# Altium footprint library 集大电协1.2.PcbLib: 175 footprints (part 10 of 11)
Each footprint in its own frame and in the unit in brackets; x right, y up, seen from the top. Pads: shape width x height; smd on the part's side, far side on the other; paste and mask are expansions set on the pad; w line width, h text height; cw(c..) or ccw(c..) is an arc to the next point about the centre after c.
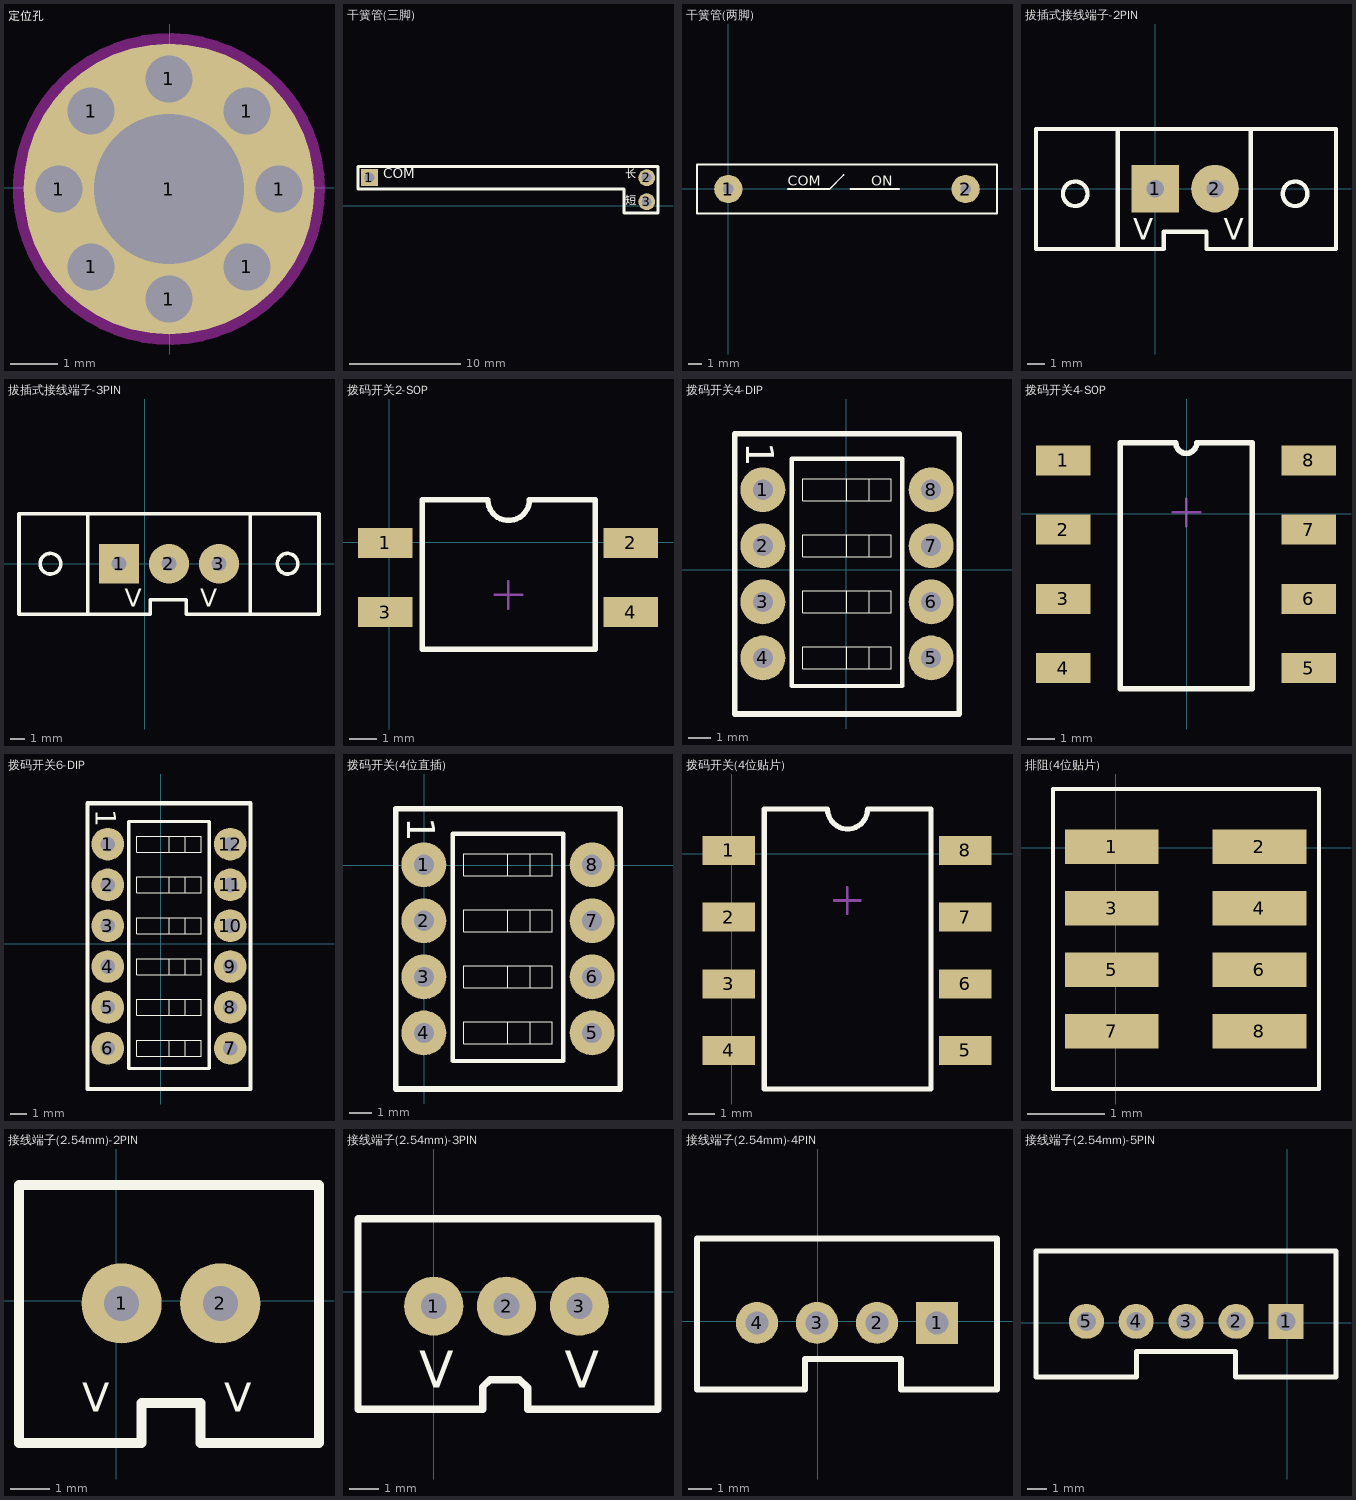
[diagram p9: the footprints below, top view; thin cyan lines are the x and y axes]

## 定位孔 [mm]
pads (9):
  round 1 hole 1: 1(-2.368,-0.023) 1(-1.679,-1.685) 1(-1.679,1.638) 1(-0.018,-2.373) 1(-0.018,2.327) 1(1.644,-1.685) 1(1.644,1.638) 1(2.332,-0.023)
  round 6.2 hole 3.2: 1(-0.018,-0.023)
Keep-Out Layer:
  circle w0.254: c-0.018,-0.023 r3.2

## 干簧管(三脚) [mil]
pads (3):
  rect 60x60 hole 35: 1(95,100)
  round 60 hole 35: 2(1075,100) 3(1075,15)
Top Overlay:
  lines w10: 55,60 55,140 1115,140 1115,-25 995,-25 995,60 55,60
  text "长" at 1000,90 h50
  text "短" at 1000,-5 h50
  text "COM" at 145,85 h60
3D body: height 69.95, standoff -9.95, extent 418.15,65 811.85,144.79
3D body: height 44.97, standoff 5.03, extent 368.15,84.89 418.15,124.89
3D body: height 44.97, standoff 5.03, extent 813.15,84.9 863.15,124.9

## 干簧管(两脚) [mil]
pads (2):
  round 80 hole 30: 1(0.98,-0.98) 2(670.28,-0.98)
Top Overlay:
  lines w5: 168.31,-0.98 286.42,-0.98 325.79,38.39 ; 345.47,-0.98 483.27,-0.98 ; -87.6,-69.88 758.86,-69.88 758.86,67.91 -87.6,67.91 -87.6,-69.88
  text "COM" at 168.31,-0.98 h50
  text "ON" at 404.53,-0.98 h50
3D body: height 44.97, standoff 5.03, extent 633.86,-20.47 683.86,19.53
3D body: height 44.97, standoff 5.03, extent -8.86,-20.98 41.14,19.02
3D body: height 69.92, standoff -9.92, extent 43.31,-40.31 633.86,39.37

## 拔插式接线端子-2PIN [mil]
pads (2):
  rect 110x110 hole 40: 1(0,0)
  round 110 hole 40: 2(137.8,0)
Top Overlay:
  circle w10: c322.83,-11.81 r28.39
  circle w10: c-185.04,-11.81 r28.39
  lines w10: -86.61,-139.32 -86.61,137.8 ; 220.47,-137.8 220.47,137.8 ; -275.59,-139.32 -275.59,137.8 417.32,137.8 417.32,-139.32 118.11,-139.32 118.11,-99.32 19.68,-99.32 19.68,-139.32 -275.59,-139.32
  text "V" at -51.18,-118.11 h50
  text "V" at 157.48,-118.11 h50
3D body: height 433.07, standoff -78.74, extent -129.92,-157.48 263.78,157.48

## 拔插式接线端子-3PIN [mil]
pads (3):
  rect 110x110 hole 40: 1(-70.87,0)
  round 110 hole 40: 2(66.93,0) 3(204.72,0)
Top Overlay:
  circle w10: c393.7,0 r28.39
  circle w10: c-259.84,0 r28.39
  lines w10: -157.48,-139.32 -157.48,137.8 ; 291.34,-137.8 291.34,137.8 ; -346.46,-139.32 -346.46,137.8 480.31,137.8 480.31,-139.32 114.17,-139.32 114.17,-99.32 15.75,-99.32 15.75,-139.32 -346.46,-139.32
  text "V" at -55.12,-118.11 h50
  text "V" at 153.54,-118.11 h50
3D body: height 433.07, standoff -78.74, extent -236.22,-161.42 354.33,153.54

## 拨码开关2-SOP [mm]
pads (4):
  rect 2x1.1 smd: 1(-0.153,-0.029) 2(8.847,-0.029) 3(-0.153,-2.569) 4(8.847,-2.569)
Top Overlay:
  lines w0.2: 7.525,-3.923 1.195,-3.923 1.195,1.552 3.608,1.552 ccw(c4.37,1.552) 5.132,1.552 7.545,1.552 7.545,-3.925
Mechanical 15:
  lines w0.1: 3.857,-1.934 4.857,-1.934 ; 4.357,-2.434 4.357,-1.434
3D body: height 2, standoff 0, extent 0.925,-3.875 7.783,1.55
3D body: height 2.05, standoff 2, extent 2.338,-0.734 6.783,0.79
3D body: height 2.05, standoff 2, extent 2.338,-3.274 6.783,-1.75
3D body: height 2.15, standoff 2.05, extent 5.259,-0.734 6.783,0.79
3D body: height 2.15, standoff 2.05, extent 2.338,-3.274 3.862,-1.75

## 拨码开关4-DIP [mil]
pads (8):
  round 80 hole 36: 1(-148.7,142.5) 2(-148.7,42.5) 3(-148.7,-57.5) 4(-148.7,-157.5) 5(151.3,-157.5) 6(151.3,-57.5) 7(151.3,42.5) 8(151.3,142.5)
Top Overlay:
  lines w0.98: 1.3,-177.19 1.3,-137.82 ; 1.3,-77.19 1.3,-37.82 ; 1.3,22.81 1.3,62.18 ; 1.3,122.81 1.3,162.18 ; 40.67,-177.19 40.67,-137.82 ; 40.67,-77.19 40.67,-37.82 ; 40.67,22.81 40.67,62.18 ; 40.67,122.81 40.67,162.18 ; -77.44,-177.19 -77.44,-137.82 80.04,-137.82 80.04,-177.19 -77.44,-177.19 ; -77.44,-77.19 -77.44,-37.82 80.04,-37.82 80.04,-77.19 -77.44,-77.19 ; -77.44,22.81 -77.44,62.18 80.04,62.18 80.04,22.81 -77.44,22.81 ; -77.44,122.81 -77.44,162.18 80.04,162.18 80.04,122.81 -77.44,122.81
  lines w7.87: -97.13,-207.5 -97.13,197.62 99.73,197.62 99.73,-207.5 -97.13,-207.5
  lines w10: -198.7,-257.5 201.3,-257.5 201.3,242.5 -198.7,242.5 -198.7,-257.5
  text "1" at -178.7,227.5 h50
3D body: height 275.59, standoff -145.67, extent -195.47,-227.19 194.3,212.19

## 拨码开关4-SOP [mm]
pads (8):
  rect 2x1.1 smd: 1(-4.52,1.958) 2(-4.52,-0.582) 3(-4.52,-3.122) 4(-4.52,-5.662) 5(4.48,-5.662) 6(4.48,-3.122) 7(4.48,-0.582) 8(4.48,1.958)
Top Overlay:
  lines w0.203: -0.405,2.603 -2.423,2.603 -2.423,-6.424 2.403,-6.424 2.403,2.603 0.371,2.603 ; -0.391,2.593 ccw(c-0.01,2.593) 0.371,2.593
Mechanical 15:
  lines w0.1: -0.51,0.053 0.49,0.053 ; -0.01,-0.447 -0.01,0.553

## 拨码开关6-DIP [mil]
pads (12):
  round 80 hole 36: 1(-130.2,243.9) 2(-130.2,143.9) 3(-130.2,43.9) 4(-130.2,-56.1) 5(-130.2,-156.1) 6(-130.2,-256.1) 7(169.8,-256.1) 8(169.8,-156.1) 9(169.8,-56.1) 10(169.8,43.9) 11(169.8,143.9) 12(169.8,243.9)
Top Overlay:
  lines w0.98: 19.8,-275.79 19.8,-236.42 ; 19.8,-175.79 19.8,-136.42 ; 19.8,-75.79 19.8,-36.42 ; 19.8,24.21 19.8,63.58 ; 19.8,124.21 19.8,163.58 ; 19.8,224.21 19.8,263.58 ; 59.17,-275.79 59.17,-236.42 ; 59.17,-175.79 59.17,-136.42 ; 59.17,-75.79 59.17,-36.42 ; 59.17,24.21 59.17,63.58 ; 59.17,124.21 59.17,163.58 ; 59.17,224.21 59.17,263.58 ; -58.94,-275.79 -58.94,-236.42 98.54,-236.42 98.54,-275.79 -58.94,-275.79 ; -58.94,-175.79 -58.94,-136.42 98.54,-136.42 98.54,-175.79 -58.94,-175.79 ; -58.94,-75.79 -58.94,-36.42 98.54,-36.42 98.54,-75.79 -58.94,-75.79 ; -58.94,24.21 -58.94,63.58 98.54,63.58 98.54,24.21 -58.94,24.21 ; -58.94,124.21 -58.94,163.58 98.54,163.58 98.54,124.21 -58.94,124.21 ; -58.94,224.21 -58.94,263.58 98.54,263.58 98.54,224.21 -58.94,224.21
  lines w7.87: -78.63,-306.1 -78.63,299.02 118.23,299.02 118.23,-306.1 -78.63,-306.1
  lines w10: -180.2,-356.1 -180.2,343.9 219.8,343.9 219.8,-356.1 -180.2,-356.1
  text "1" at -160.2,328.9 h50
3D body: height 275.59, standoff -145.67, extent -177.2,-322.79 212.57,316.59

## 拨码开关(4位直插) [mil]
pads (8):
  round 80 hole 36: 1(-1,1) 2(-1,-99) 3(-1,-199) 4(-1,-299) 5(299,-299) 6(299,-199) 7(299,-99) 8(299,1)
Top Overlay:
  lines w0.98: 149,-318.69 149,-279.32 ; 149,-218.69 149,-179.32 ; 149,-118.69 149,-79.32 ; 149,-18.69 149,20.68 ; 188.37,-318.69 188.37,-279.32 ; 188.37,-218.69 188.37,-179.32 ; 188.37,-118.69 188.37,-79.32 ; 188.37,-18.69 188.37,20.68 ; 70.26,-318.69 70.26,-279.32 227.74,-279.32 227.74,-318.69 70.26,-318.69 ; 70.26,-218.69 70.26,-179.32 227.74,-179.32 227.74,-218.69 70.26,-218.69 ; 70.26,-118.69 70.26,-79.32 227.74,-79.32 227.74,-118.69 70.26,-118.69 ; 70.26,-18.69 70.26,20.68 227.74,20.68 227.74,-18.69 70.26,-18.69
  lines w7.87: 50.57,-349 50.57,56.12 247.43,56.12 247.43,-349 50.57,-349
  lines w10: -51,-399 349,-399 349,101 -51,101 -51,-399
  text "1" at -31,86 h50
3D body: height 275.59, standoff -145.67, extent -47.77,-368.69 342,70.69

## 拨码开关(4位贴片) [mm]
pads (8):
  rect 2x1.1 smd: 1(-0.103,0.121) 2(-0.103,-2.419) 3(-0.103,-4.959) 4(-0.103,-7.499) 5(8.897,-7.499) 6(8.897,-4.959) 7(8.897,-2.419) 8(8.897,0.121)
Top Overlay:
  lines w0.2: 1.245,-8.966 7.595,-8.966 7.595,1.702 5.182,1.702 cw(c4.42,1.702) 3.658,1.702 1.245,1.702 1.245,-8.966
Mechanical 15:
  lines w0.1: 3.907,-1.784 4.907,-1.784 ; 4.407,-2.284 4.407,-1.284
3D body: height 2, standoff 0, extent 0.991,-8.712 7.849,1.575
3D body: height 2.05, standoff 2, extent 2.388,-0.584 6.833,0.94
3D body: height 2.05, standoff 2, extent 2.388,-3.124 6.833,-1.6
3D body: height 2.05, standoff 2, extent 2.388,-5.664 6.833,-4.14
3D body: height 2.05, standoff 2, extent 2.388,-8.204 6.833,-6.68
3D body: height 2.15, standoff 2.05, extent 5.309,-0.584 6.833,0.94
3D body: height 2.15, standoff 2.05, extent 2.388,-3.124 3.912,-1.6
3D body: height 2.15, standoff 2.05, extent 5.309,-5.664 6.833,-4.14
3D body: height 2.15, standoff 2.05, extent 5.309,-8.204 6.833,-6.68

## 排阻(4位贴片) [mm]
pads (8):
  rect 1.22x0.45 smd: 1(-0.051,0.013) 2(1.869,0.013) 3(-0.051,-0.787) 4(1.869,-0.787) 5(-0.051,-1.587) 6(1.869,-1.587) 7(-0.051,-2.387) 8(1.869,-2.387)
Top Overlay:
  lines w0.05: -0.813,-3.137 2.642,-3.137 2.642,0.763 -0.813,0.763 -0.813,-3.137
3D body "R1206-4R.step": height 0.59, standoff 0.01, extent 0.102,-2.794 1.702,0.406

## 接线端子(2.54mm)-2PIN [mil]
pads (2):
  round 80 hole 35: 1(5.42,-2.44) 2(103.84,-2.44)
Top Overlay:
  lines w10: 141.42,-141.76 202.27,-141.76 202.27,115.67 -96.94,115.67 -96.94,-141.76 25.1,-141.76 25.1,-101.76 84.16,-101.76 84.16,-141.76 151.42,-141.76
  text "V" at -33.95,-120.55 h50
  text "V" at 107.78,-120.55 h50
3D body: height 459.84, standoff -140.16, extent -48.52,-139.05 151.48,110.95

## 接线端子(2.54mm)-3PIN [mil]
pads (3):
  round 80 hole 35: 1(0,-19.68) 2(98.43,-19.68) 3(196.85,-19.68)
Top Overlay:
  lines w10: 136,-159 303.15,-159 303.15,98.43 -102.36,98.43 -102.36,-159 66,-159 66,-129 76,-119 116,-119 127,-130 127,-159 146,-159
  text "V" at -19.68,-129.92 h50
  text "V" at 177.17,-129.92 h50
3D body: height 459.84, standoff -140.16, extent -51.57,-157.48 248.43,92.52

## 接线端子(2.54mm)-4PIN [mil]
pads (4):
  rect 70x70 hole 38: 1(199.11,-3)
  round 70 hole 38: 2(99.11,-3) 3(-0.89,-3) 4(-100.89,-3)
Top Overlay:
  lines w10: -200.89,-114.17 -20.89,-114.17 -20.89,-63 -0.89,-63 139.11,-63 139.11,-114.17 299.11,-114.17 299.11,137.8 -200.89,137.8 -200.89,-114.17
3D body: height 459.84, standoff -140.16, extent -148.82,-118.11 251.18,131.89

## 接线端子(2.54mm)-5PIN [mil]
pads (5):
  rect 70x70 hole 38: 1(-2.66,2.91)
  round 70 hole 38: 2(-102.66,2.91) 3(-202.66,2.91) 4(-302.66,2.91) 5(-402.07,2.91)
Top Overlay:
  lines w10: -502.95,-108.27 -302.17,-108.27 -302.17,-57.09 -202.66,-57.09 -103.35,-57.09 -103.35,-108.27 97.34,-108.27 97.34,143.7 -502.95,143.7 -502.95,-108.27
3D body: height 236.22, standoff -98.43, extent -493.11,-78.74 97.44,70.87